# Altium footprint library Transformers.PcbLib: 80 footprints (part 4 of 6)
Each footprint in its own frame and in the unit in brackets; x right, y up, seen from the top. Pads: shape width x height; smd on the part's side, far side on the other; paste and mask are expansions set on the pad; w line width, h text height; cw(c..) or ccw(c..) is an arc to the next point about the centre after c.
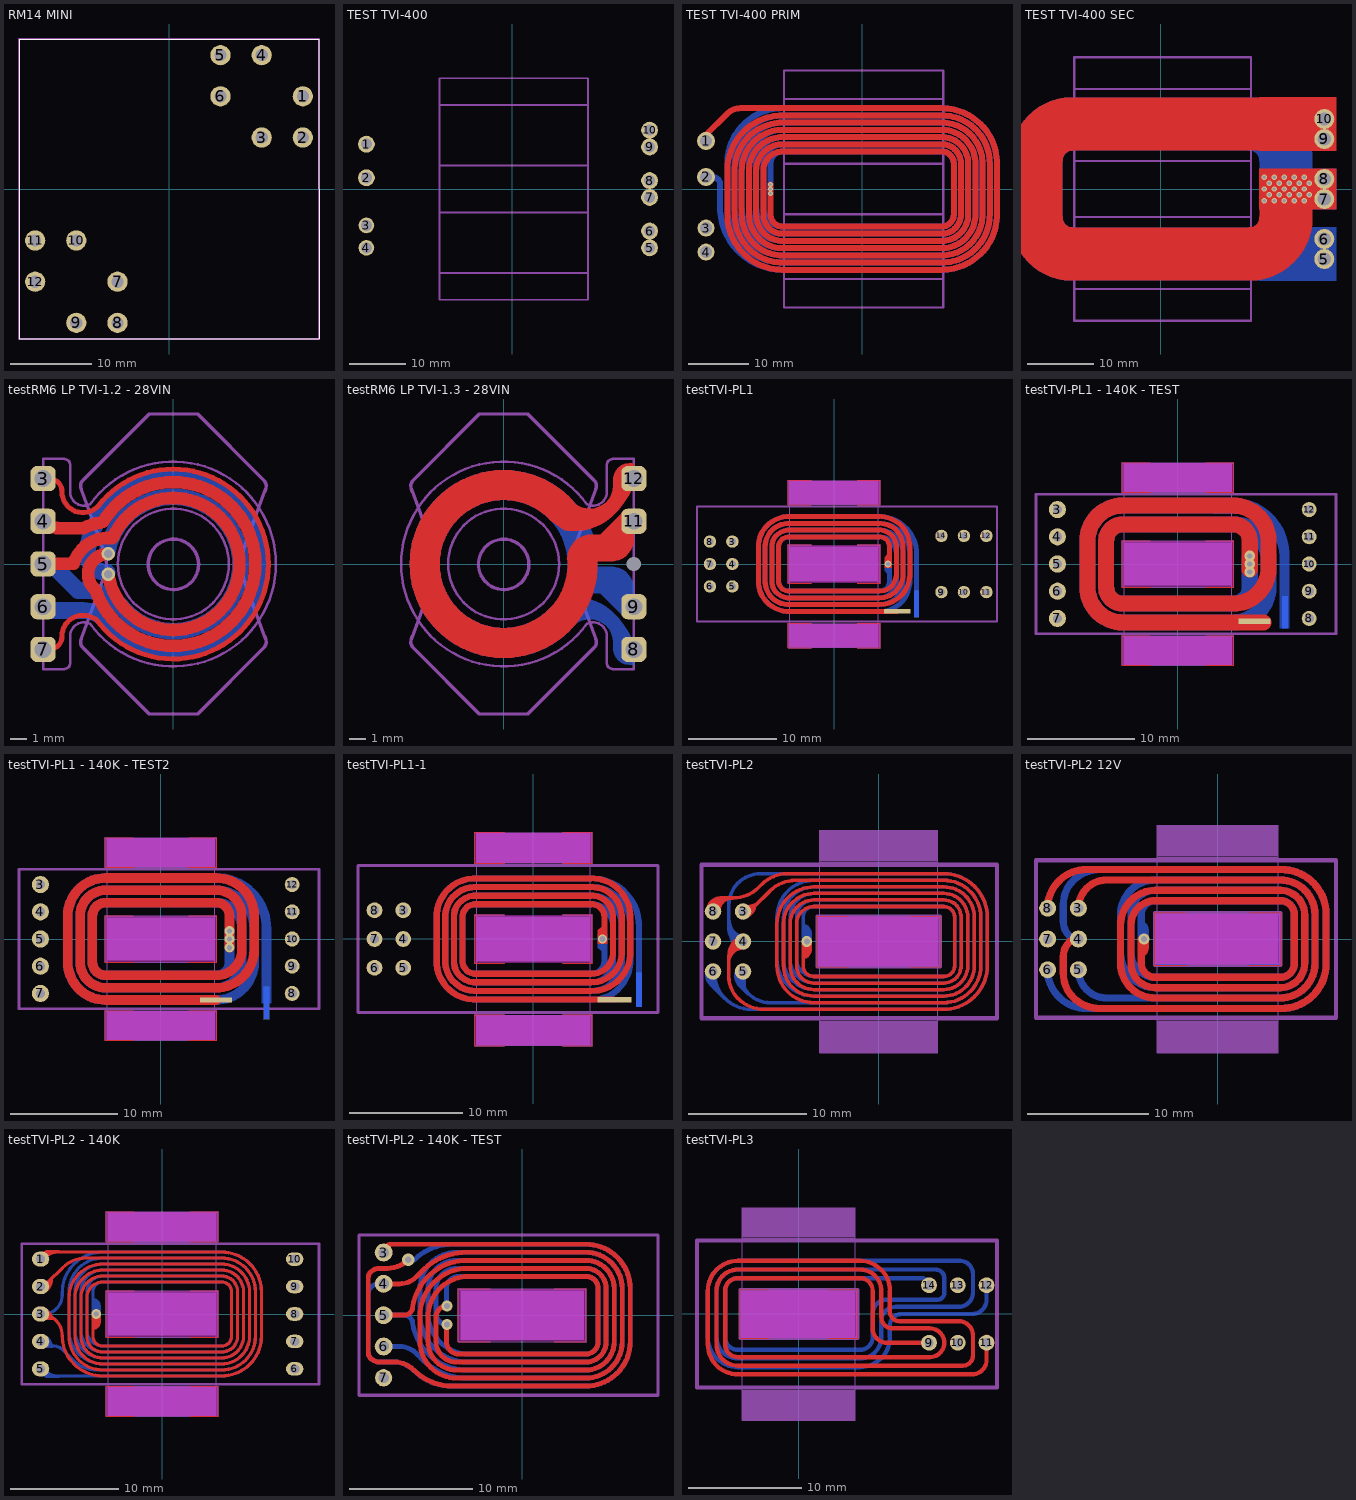
[diagram p3: the footprints below, top view; thin cyan lines are the x and y axes]

## RM14 MINI [mm]
pads (12):
  round 2.5 hole 1.5: 1(16.51,11.43) 2(16.51,6.35) 3(11.43,6.35) 4(11.43,16.51) 5(6.35,16.51) 6(6.35,11.43) 7(-6.35,-11.43) 8(-6.35,-16.51) 9(-11.43,-16.51) 10(-11.43,-6.35) 11(-16.51,-6.35) 12(-16.51,-11.43)
Top Overlay:
  lines w0.15: -18.5,-18.5 18.5,-18.5 18.5,18.5 -18.5,18.5 -18.5,-18.5
Mechanical 13:
  lines w0.25: -18.5,-18.5 18.5,-18.5 18.5,18.5 -18.5,18.5 -18.5,-18.5
3D body "RM14-K-12P-TBI.STEP": height 29.67, standoff -1.3, extent -30.017,-30.017 30.017,30.017

## TEST TVI-400 [mm]
pads (10):
  round 3 hole 2: 1(-26,8) 2(-26,2) 5(24.5,-10.5) 6(24.5,-7.5) 7(24.5,-1.5) 8(24.5,1.5) 9(24.5,7.5) 10(24.5,10.5)
  round 2.8 hole 2: 3(-26,-6.5) 4(-26,-10.5)
Mechanical 13:
  lines w0.35: -13,-15 13.5,-15 ; -13,-4.2 13.5,-4.2 ; -13,4.2 13.5,4.2 ; -13,15 13.5,15 ; -13,-19.75 -13,0 -13,19.75 13.5,19.75 13.5,0 13.5,-19.75 -13,-19.75

## TEST TVI-400 PRIM [mm]
pads (4):
  round 3 hole 2: 1(-26,8) 2(-26,2)
  round 2.8 hole 2: 3(-26,-6.5) 4(-26,-10.5)
via -15.25,-0.75 diameter 0.8 hole 0.5
via -15.25,0 diameter 0.8 hole 0.5
via -15.25,0.75 diameter 0.8 hole 0.5
Top Layer:
  lines w1: -26,8 -26,9 -22.448,12.552 cw(c-20.28,10.384) -20.28,13.45 -13.25,13.45 13.25,13.45 cw(c13.25,4.25) 22.45,4.25 22.45,-4.25 cw(c13.25,-4.25) 13.25,-13.45 -13.25,-13.45 cw(c-13.25,-4.25) -22.45,-4.25 -22.45,0 -22.45,3.05 cw(c-13.25,3.05) -13.25,12.25 13.25,12.25 cw(c13.25,4.25) 21.25,4.25 21.25,-4.25 cw(c13.25,-4.25) 13.25,-12.25 -13.25,-12.25 cw(c-13.25,-4.25) -21.25,-4.25 -21.25,0 -21.25,3.05 cw(c-13.25,3.05) -13.25,11.05 13.25,11.05 cw(c13.25,4.25) 20.05,4.25 20.05,-4.25 cw(c13.25,-4.25) 13.25,-11.05 -13.25,-11.05 cw(c-13.25,-4.25) -20.05,-4.25 -20.05,0 -20.05,3.05 cw(c-13.25,3.05) -13.25,9.85 13.25,9.85 cw(c13.25,4.25) 18.85,4.25 18.85,-4.25 cw(c13.25,-4.25) 13.25,-9.85 -13.25,-9.85 cw(c-13.25,-4.25) -18.85,-4.25 -18.85,0 -18.85,3.05 cw(c-13.25,3.05) -13.25,8.65 13.25,8.65 cw(c13.25,4.25) 17.65,4.25 17.65,-4.25 cw(c13.25,-4.25) 13.25,-8.65 -13.25,-8.65 cw(c-13.25,-4.25) -17.65,-4.25 -17.65,0 -17.65,3.05 cw(c-13.25,3.05) -13.25,7.45 13.25,7.45 cw(c13.25,4.25) 16.45,4.25 16.45,-4.25 cw(c13.25,-4.25) 13.25,-7.45 -13.25,-7.45 cw(c-13.25,-4.25) -16.45,-4.25 -16.45,0 -16.45,3.05 cw(c-13.25,3.05) -13.25,6.25 13.25,6.25 cw(c13.25,4.25) 15.25,4.25 15.25,-4.25 cw(c13.25,-4.25) 13.25,-6.25 -13.25,-6.25 cw(c-13.25,-4.25) -15.25,-4.25 -15.25,0.75
Bottom Layer:
  lines w1: -27,2 -24.92,2 cw(c-24.92,0.73) -23.65,0.73 -23.65,0 -23.65,-3.05 ccw(c-13.25,-3.05) -13.25,-13.45 13.25,-13.45 ccw(c13.25,-4.25) 22.45,-4.25 22.45,4.25 ccw(c13.25,4.25) 13.25,13.45 -13.25,13.45 ccw(c-13.25,4.25) -22.45,4.25 -22.45,0 -22.45,-3.05 ccw(c-13.25,-3.05) -13.25,-12.25 13.25,-12.25 ccw(c13.25,-4.25) 21.25,-4.25 21.25,4.25 ccw(c13.25,4.25) 13.25,12.25 -13.25,12.25 ccw(c-13.25,4.25) -21.25,4.25 -21.25,0 -21.25,-3.05 ccw(c-13.25,-3.05) -13.25,-11.05 13.25,-11.05 ccw(c13.25,-4.25) 20.05,-4.25 20.05,4.25 ccw(c13.25,4.25) 13.25,11.05 -13.25,11.05 ccw(c-13.25,4.25) -20.05,4.25 -20.05,0 -20.05,-3.05 ccw(c-13.25,-3.05) -13.25,-9.85 13.25,-9.85 ccw(c13.25,-4.25) 18.85,-4.25 18.85,4.25 ccw(c13.25,4.25) 13.25,9.85 -13.25,9.85 ccw(c-13.25,4.25) -18.85,4.25 -18.85,0 -18.85,-3.05 ccw(c-13.25,-3.05) -13.25,-8.65 13.25,-8.65 ccw(c13.25,-4.25) 17.65,-4.25 17.65,4.25 ccw(c13.25,4.25) 13.25,8.65 -13.25,8.65 ccw(c-13.25,4.25) -17.65,4.25 -17.65,0 -17.65,-3.05 ccw(c-13.25,-3.05) -13.25,-7.45 13.25,-7.45 ccw(c13.25,-4.25) 16.45,-4.25 16.45,4.25 ccw(c13.25,4.25) 13.25,7.45 -13.25,7.45 ccw(c-13.25,4.25) -16.45,4.25 -16.45,0 -16.45,-3.05 ccw(c-13.25,-3.05) -13.25,-6.25 13.25,-6.25 ccw(c13.25,-4.25) 15.25,-4.25 15.25,4.25 ccw(c13.25,4.25) 13.25,6.25 -13.25,6.25 ccw(c-13.25,4.25) -15.25,4.25 -15.25,-0.75
Mechanical 13:
  lines w0.35: -13,-15 13.5,-15 ; -13,-4.2 13.5,-4.2 ; -13,4.2 13.5,4.2 ; -13,15 13.5,15 ; -13,-19.75 -13,0 -13,19.75 13.5,19.75 13.5,0 13.5,-19.75 -13,-19.75

## TEST TVI-400 SEC [mm]
pads (6):
  round 3 hole 2: 5(24.5,-10.5) 6(24.5,-7.5) 7(24.5,-1.5) 8(24.5,1.5) 9(24.5,7.5) 10(24.5,10.5)
via 15.5,-1.75 diameter 0.8 hole 0.5
via 17,-1.75 diameter 0.8 hole 0.5
via 18.5,-1.75 diameter 0.8 hole 0.5
via 20,-1.75 diameter 0.8 hole 0.5
via 21.5,-1.75 diameter 0.8 hole 0.5
via 16.25,-0.875 diameter 0.8 hole 0.5
via 17.75,-0.875 diameter 0.8 hole 0.5
via 19.25,-0.875 diameter 0.8 hole 0.5
via 20.75,-0.875 diameter 0.8 hole 0.5
via 22.25,-0.875 diameter 0.8 hole 0.5
via 22.25,0.875 diameter 0.8 hole 0.5
via 20.75,0.875 diameter 0.8 hole 0.5
via 19.25,0.875 diameter 0.8 hole 0.5
via 17.75,0.875 diameter 0.8 hole 0.5
via 16.25,0.875 diameter 0.8 hole 0.5
via 15.5,1.75 diameter 0.8 hole 0.5
via 21.5,0 diameter 0.8 hole 0.5
via 20,0 diameter 0.8 hole 0.5
via 18.5,0 diameter 0.8 hole 0.5
via 17,0 diameter 0.8 hole 0.5
via 15.5,0 diameter 0.8 hole 0.5
via 21.5,1.75 diameter 0.8 hole 0.5
via 20,1.75 diameter 0.8 hole 0.5
via 17,1.75 diameter 0.8 hole 0.5
via 18.5,1.75 diameter 0.8 hole 0.5
Top Layer:
  region: 14.75,5.75 14.75,13.75 26.25,13.75 26.25,5.75
  region: 14.75,-3 14.75,3 26.25,3 26.25,-3
  lines w8: 18.75,-4.25 cw(c13.25,-4.25) 13.25,-9.75 -13.25,-9.75 cw(c-13.25,-4.25) -18.75,-4.25 -18.75,4.25 cw(c-13.25,4.25) -13.25,9.75 18.75,9.75 ; 18.75,-4 18.75,-1
Bottom Layer:
  region: 23,1 23,3 26.25,3 26.25,1
  region: 14.75,-5.75 14.75,-13.75 26.25,-13.75 26.25,-5.75
  region: 14.75,3 14.75,-3 26.25,-3 26.25,3
  lines w8: 18.75,-9.75 -13.25,-9.75 cw(c-13.25,-4.25) -18.75,-4.25 -18.75,4.25 cw(c-13.25,4.25) -13.25,9.75 13.25,9.75 cw(c13.25,4.25) 18.75,4.25 ; 18.75,1 18.75,4
Mechanical 13:
  lines w0.35: -13,-15 13.5,-15 ; -13,-4.2 13.5,-4.2 ; -13,4.2 13.5,4.2 ; -13,15 13.5,15 ; -13,-19.75 13.5,-19.75 13.5,0 13.5,19.75 -13,19.75 -13,0 -13,-19.75

## testRM6 LP TVI-1.2 - 28VIN [mm]
pads (5):
  rrect50% 1.5x1.5 hole 1: 3(-7.75,5.08) 4(-7.75,2.54) 5(-7.75,0) 6(-7.75,-2.54) 7(-7.75,-5.08)
via -3.875,-0.6 diameter 0.8 hole 0.5
via -3.875,0.6 diameter 0.8 hole 0.5
Top Layer:
  lines w0.3: -7.75,-5.08 -7.391,-5.08 ccw(c-7.391,-4.319) -6.631,-4.319 cw(c-5.381,-4.302) -4.842,-3.174 -4.591,-3.293 ccw(c0,0) 5.65,0 ccw(c0,0) 0,5.65 ccw(c0,0) -4.46,3.469 ; -7.75,5.08 cw(c-7.75,4.67) -7.46,4.96 ; -7.391,5.08 cw(c-7.391,4.319) -6.631,4.319 ccw(c-5.381,4.302) -4.457,3.461
  lines w0.75: -7.71,2.5 -7.75,2.54 ccw(c-6.758,3.532) -6.758,2.129 -5.345,2.129 cw(c-3.875,-0.6) -4.352,2.463 ; -4.627,-1.535 cw(c-3.875,-0.6) -3.875,0.6 ; -4.625,-1.542 ccw(c0,0) 0,-4.875 ccw(c0,0) 4.875,0 ccw(c0,0) 0,4.875 ccw(c0,0) -4.171,2.523 ; -4.488,1.461 -4.485,1.461 ; -3.879,-0.601 ccw(c0,0) 0,-3.925 ccw(c0,0) 3.925,0 ccw(c0,0) 0,3.925 ccw(c0,0) -3.587,1.594 ; -3.651,1.538 ccw(c-3.875,-0.6) -5.935,0.017 -7.733,0.017 ; -7.733,0.017 ccw(c-7.733,0) -7.75,0 cw(c-7.733,0) -7.733,0.017
Mid-Layer 14:
  lines w0.15: -7.75,-5.58 ccw(c-7.75,-5.08) -7.75,-4.58 ; -7.75,-3.04 ccw(c-7.75,-2.54) -7.75,-2.04 ; -7.75,2.04 ccw(c-7.75,2.54) -7.75,3.04 ; -7.75,4.58 ccw(c-7.75,5.08) -7.75,5.58
Bottom Layer:
  lines w0.254: -7.75,-2.54 ccw(c-7.423,-2.213) -7.423,-2.675
  lines w1: -7.198,-0.052 -5.677,-1.573 -5.3,-1.573 cw(c-5.3,-4.584) -3.17,-2.455 ; -7.189,-2.773 -5.4,-2.773 cw(c-5.4,-4.773) -3.986,-3.358 -3.862,-3.482 ccw(c0,0) 0,-5.2 ccw(c0,0) 5.2,0 ccw(c0,0) 0,5.2 ccw(c0,0) -5.148,0.73 ; -5.142,0.836 ccw(c-3.95,0.7) -3.95,-0.5 ; -3.938,0.7 cw(c0,0) 0,4 cw(c0,0) 4,0 cw(c0,0) 0,-4 cw(c0,0) -3.163,-2.449 ; -7.75,-2.54 cw(c-7.693,-2.597) -7.693,-2.516 ccw(c-7.693,-2.597) -7.75,-2.54
Mechanical 2:
  circle w0.15: c0,0 r3.302
  lines w0.15: -4.978,-3.556 ccw(c-5.329,-4.289) -6.141,-4.301 -6.141,-5.706 -6.141,-5.891 cw(c-6.5,-5.891) -6.5,-6.25 -7.75,-6.25 -7.75,6.25 ; -4.978,3.556 cw(c-5.329,4.289) -6.141,4.301 -6.141,5.706 -6.141,5.891 ccw(c-6.5,5.891) -6.5,6.25 -7.541,6.25 -7.75,6.25 ; -4.961,-3.543 ccw(c0,0) 6.096,0 ccw(c0,0) -4.961,3.543 ; -7.75,6.25 ccw(c-7.75,6.25) -7.75,6.25 ; -7.75,6.25 ccw(c-7.75,6.25) -7.75,6.25 ; -7.75,6.25 -7.75,6.25
Mechanical 13:
  circle w0.2: c0.002,-0.023 r1.5
  lines w0.2: -5.434,-4.308 -5.493,-4.471 ccw(c-5.023,-4.642) -5.377,-4.996 -1.446,-8.927 1.446,-8.927 5.377,-4.996 ccw(c5.023,-4.642) 5.493,-4.471 5.434,-4.308 ; -5.434,4.308 -5.493,4.471 cw(c-5.023,4.642) -5.377,4.996 -1.446,8.927 1.446,8.927 5.377,4.996 cw(c5.023,4.642) 5.493,4.471 5.434,4.308 ; -4.103,-0.707 ccw(c-5.982,-0.023) -4.103,0.661 -5.49,4.471 cw(c-5.02,4.642) -5.373,4.996 -3.14,7.23 ; -4.103,0.707 cw(c-5.982,0.023) -4.103,-0.661 -5.49,-4.471 ccw(c-5.02,-4.642) -5.373,-4.996 -3.14,-7.23 ; 0,1.477 cw(c-0.002,-0.023) 1.498,-0.023 ; 3.14,-7.23 5.373,-4.996 ccw(c5.02,-4.642) 5.49,-4.471 4.103,-0.661 cw(c5.982,0.023) 4.103,0.707 ; 3.14,7.23 5.373,4.996 cw(c5.02,4.642) 5.49,4.471 4.103,0.661 ccw(c5.982,-0.023) 4.103,-0.707

## testRM6 LP TVI-1.3 - 28VIN [mm]
pads (5):
  rrect50% 1.5x1.5 hole 1: 8(7.75,-5.08) 9(7.75,-2.54) 11(7.75,2.54) 12(7.75,5.08)
  round 0 hole 0.85: 10(7.75,0)
Top Layer:
  region: 3.8,0.175 3.787,0.318 3.819,0.603 3.905,0.877 4.043,1.129 4.227,1.349 4.451,1.529 4.706,1.662 4.982,1.742 5.125,1.755 5.755,1.755 7.228,3.228 7.75,3.228 7.75,1.5 7.75,1.369 7.699,1.114 7.599,0.872 7.454,0.655 7.27,0.471 7.053,0.326 6.811,0.226 6.556,0.175 6.425,0.175
  region: 3.8,0.175
  region: 4.275,3.575 4.385,3.499 4.624,3.379 4.882,3.307 5.148,3.285 5.414,3.314 5.67,3.394 5.905,3.52 6.113,3.689 6.284,3.895 6.413,4.129 6.496,4.383 6.528,4.649 6.525,4.783 6.525,5.025 6.525,5.138 6.577,5.358 6.678,5.561 6.822,5.735 7.003,5.871 7.209,5.963 7.432,6.004 7.658,5.994 7.767,5.963 7.78,5.745 7.764,5.31 7.704,4.878 7.6,4.455 7.527,4.25 7.41,4.02 7.13,3.588 6.809,3.185 6.448,2.817 6.25,2.652 6.11,2.547 5.811,2.367 5.494,2.218 5.165,2.101 4.825,2.019 4.478,1.971 4.129,1.958 3.78,1.981 3.608,2.01 3,2.414 3,3 3.127,3.126 3.422,3.329 3.749,3.476 4.096,3.563
  region: 6.75,2.75 7.25,3.25 7.75,2.75 7.75,1.5 7.25,1.5 6.875,1.125 6.75,1.25
  lines w1.8: 3.435,3.208 ccw(c0,0) 0,4.7 ccw(c0,0) -4.7,0 ccw(c0,0) 0,-4.7 ccw(c0,0) 4.7,0
Mid-Layer 14:
  lines w0.15: 7.75,-5.58 cw(c7.75,-5.08) 7.75,-4.58 ; 7.75,2.04 cw(c7.75,2.54) 7.75,3.04 ; 7.75,4.58 cw(c7.75,5.08) 7.75,5.58
Bottom Layer:
  region: 4.275,-3.575 4.385,-3.499 4.624,-3.379 4.882,-3.307 5.148,-3.285 5.414,-3.314 5.67,-3.394 5.905,-3.52 6.113,-3.689 6.284,-3.895 6.413,-4.129 6.496,-4.383 6.528,-4.649 6.525,-4.783 6.525,-5.025 6.525,-5.138 6.577,-5.358 6.678,-5.561 6.822,-5.735 7.003,-5.871 7.209,-5.963 7.432,-6.004 7.658,-5.994 7.767,-5.963 7.78,-5.745 7.764,-5.31 7.704,-4.878 7.6,-4.455 7.527,-4.25 7.41,-4.02 7.13,-3.588 6.809,-3.185 6.448,-2.817 6.25,-2.652 6.11,-2.547 5.811,-2.367 5.494,-2.218 5.165,-2.101 4.825,-2.019 4.478,-1.971 4.129,-1.958 3.78,-1.981 3.608,-2.01 3,-2.414 3,-3 3.127,-3.126 3.422,-3.329 3.749,-3.476 4.096,-3.563
  region: 3.8,-0.175 3.787,-0.318 3.819,-0.603 3.905,-0.877 4.043,-1.129 4.227,-1.349 4.451,-1.529 4.706,-1.662 4.982,-1.742 5.125,-1.755 5.755,-1.755 7.228,-3.228 7.75,-3.228 7.75,-1.5 7.75,-1.369 7.699,-1.114 7.599,-0.872 7.454,-0.655 7.27,-0.471 7.053,-0.326 6.811,-0.226 6.556,-0.175 6.425,-0.175
  lines w1.8: 3.435,-3.208 cw(c0,0) 0,-4.7 cw(c0,0) -4.7,0 cw(c0,0) 0,4.7 cw(c0,0) 4.7,0
Mechanical 2:
  circle w0.15: c0,0 r3.302
  lines w0.15: 4.961,-3.543 cw(c0,0) -6.096,0 cw(c0,0) 4.961,3.543 ; 4.978,-3.556 cw(c5.329,-4.289) 6.141,-4.301 6.141,-5.706 6.141,-5.891 ccw(c6.5,-5.891) 6.5,-6.25 7.75,-6.25 7.75,6.25 ; 4.978,3.556 ccw(c5.329,4.289) 6.141,4.301 6.141,5.706 6.141,5.891 cw(c6.5,5.891) 6.5,6.25 7.541,6.25 7.75,6.25 ; 7.75,6.25 ccw(c7.75,6.25) 7.75,6.25 ; 7.75,6.25 ccw(c7.75,6.25) 7.75,6.25 ; 7.75,6.25 7.75,6.25
Mechanical 13:
  circle w0.2: c0.002,-0.023 r1.5
  lines w0.2: -5.434,-4.308 -5.493,-4.471 ccw(c-5.023,-4.642) -5.377,-4.996 -1.446,-8.927 1.446,-8.927 5.377,-4.996 ccw(c5.023,-4.642) 5.493,-4.471 5.434,-4.308 ; -5.434,4.308 -5.493,4.471 cw(c-5.023,4.642) -5.377,4.996 -1.446,8.927 1.446,8.927 5.377,4.996 cw(c5.023,4.642) 5.493,4.471 5.434,4.308 ; -4.103,-0.707 ccw(c-5.982,-0.023) -4.103,0.661 -5.49,4.471 cw(c-5.02,4.642) -5.373,4.996 -3.14,7.23 ; -4.103,0.707 cw(c-5.982,0.023) -4.103,-0.661 -5.49,-4.471 ccw(c-5.02,-4.642) -5.373,-4.996 -3.14,-7.23 ; 0,1.477 cw(c-0.002,-0.023) 1.498,-0.023 ; 3.14,-7.23 5.373,-4.996 ccw(c5.02,-4.642) 5.49,-4.471 4.103,-0.661 cw(c5.982,0.023) 4.103,0.707 ; 3.14,7.23 5.373,4.996 cw(c5.02,4.642) 5.49,4.471 4.103,0.661 ccw(c5.982,-0.023) 4.103,-0.707

## testTVI-PL1 [mm]
pads (14):
  rect 3x0.5 smd: 1(7.15,-5.352)
  rect 0.5x3 smd far side: 2(9.314,-4.5)
  round 1.4 hole 0.8: 3(-11.5,2.54) 4(-11.5,0) 5(-11.5,-2.54) 6(-14.04,-2.54) 7(-14.04,0) 8(-14.04,2.54) 9(12.135,-3.175) 10(14.675,-3.175) 11(17.215,-3.175) 12(17.215,3.175) 13(14.675,3.175) 14(12.135,3.175)
via 6.1,0 diameter 0.8 hole 0.5
Top Layer:
  region: 401 vertices and 0 holes, not listed, extent -8.806,-5.606 8.806,5.606
  region: 6.012,1.075 5.7,0.763 5.7,-0.4 6.5,-0.4 6.5,1.075
  lines w0.1: -2.6,-9.45 -5.2,-9.45 -5.2,-6.7 -2.6,-6.7 ; -2.6,-2.15 -5.2,-2.15 -5.2,2.15 -2.6,2.15 ; -2.6,6.7 -5.2,6.7 -5.2,9.45 -2.6,9.45 ; 2.6,-9.45 5.2,-9.45 5.2,-6.7 2.6,-6.7 ; 2.6,-2.15 5.2,-2.15 5.2,2.15 2.6,2.15 ; 2.6,6.7 5.2,6.7 5.2,9.45 2.6,9.45
  text "1" at 5.5,1.5 h0.5
Bottom Layer:
  region: 430 vertices and 0 holes, not listed, extent -8.806,-5.606 9.568,5.606
  region: 6.012,-1.075 5.7,-0.763 5.7,0.4 6.5,0.4 6.5,-1.075
  lines w0.1: -2.6,-9.45 -5.2,-9.45 -5.2,-6.7 -2.6,-6.7 ; -2.6,-2.15 -5.2,-2.15 -5.2,2.15 -2.6,2.15 ; -2.6,6.7 -5.2,6.7 -5.2,9.45 -2.6,9.45 ; 2.6,-9.45 5.2,-9.45 5.2,-6.7 2.6,-6.7 ; 2.6,-2.15 5.2,-2.15 5.2,2.15 2.6,2.15 ; 2.6,6.7 5.2,6.7 5.2,9.45 2.6,9.45
  text "2" at 5.7,-1.7 h0.5
Keep-Out Layer:
  board cut-out: -5.15,9.4 -5.15,6.75 5.15,6.75 5.15,9.4
  board cut-out: -5.15,-6.75 -5.15,-9.4 5.15,-9.4 5.15,-6.75
  board cut-out: -5.15,2.1 -5.15,-2.1 5.15,-2.1 5.15,2.1
Mechanical 1:
  lines w0.254: -15.5,-6.5 18.415,-6.5 18.415,6.5 -5.5,6.5 -15.5,6.5 -15.5,-6.5
Mechanical 2:
  lines w0.1: -2.6,-9.45 -5.2,-9.45 -5.2,-6.7 -2.6,-6.7 ; -2.6,-2.15 -5.2,-2.15 -5.2,2.15 -2.6,2.15 ; -2.6,6.7 -5.2,6.7 -5.2,9.45 -2.6,9.45 ; 2.6,-9.45 5.2,-9.45 5.2,-6.7 2.6,-6.7 ; 2.6,-2.15 5.2,-2.15 5.2,2.15 2.6,2.15 ; 2.6,6.7 5.2,6.7 5.2,9.45 2.6,9.45
Mechanical 13:
  rectangle: -5,-9.4 5,-6.8
  rectangle: -5,-2 5,2
  rectangle: -5,6.75 5,9.35
  lines w0.1: -5,-6.75 5,-6.75 ; -5,-1.9 5,-1.9 ; -5,1.9 5,1.9 ; -5,6.75 5,6.75 ; -5,-9.4 5,-9.4 5,9.4 -5,9.4 -5,0 -5,-9.4
3D body: height 4, standoff 2, extent -5.15,-9.4 5.15,9.4
3D body: height 4, standoff 2, extent -5.15,-9.4 5.15,9.4
3D body: height 4, standoff -4, extent -5,-1.9 5,2
3D body: height 4, standoff -4, extent -5,-9.45 5,-6.8
3D body: height 4, standoff -4, extent -5,6.75 5,9.4

## testTVI-PL1 - 140K - TEST [mm]
pads (12):
  rect 3x0.5 smd: 1(7.15,-5.352)
  rect 0.5x3 smd far side: 2(10,-4.5)
  round 1.6 hole 0.85: 3(-11.25,5.08) 4(-11.25,2.54) 5(-11.25,0) 6(-11.25,-2.54) 7(-11.25,-5.08)
  round 1.4 hole 0.85: 8(12.25,-5.08) 9(12.25,-2.54) 10(12.25,0) 11(12.25,2.54) 12(12.25,5.08)
via 6.7,-0.75 diameter 1 hole 0.5
via 6.7,0.75 diameter 1 hole 0.5
via 6.7,0 diameter 1 hole 0.5
Top Layer:
  lines w0.1: -2.6,-9.45 -5.2,-9.45 -5.2,-6.7 -2.6,-6.7 ; -2.6,-2.15 -5.2,-2.15 -5.2,2.15 -2.6,2.15 ; -2.6,6.7 -5.2,6.7 -5.2,9.45 -2.6,9.45 ; 2.6,-9.45 5.2,-9.45 5.2,-6.7 2.6,-6.7 ; 2.6,-2.15 5.2,-2.15 5.2,2.15 2.6,2.15 ; 2.6,6.7 5.2,6.7 5.2,9.45 2.6,9.45
  lines w1.5: 6.7,-0.5 6.7,2.15 ccw(c5.15,2.15) 5.15,3.7 -5.15,3.7 ccw(c-5.15,2.15) -6.7,2.15 -6.7,-2.15 ccw(c-5.15,-2.15) -5.15,-3.7 5.15,-3.7 ccw(c5.15,-0.4) 8.45,-0.4 8.45,0 8.45,2.15 ccw(c5.15,2.15) 5.15,5.45 -5.15,5.45 ccw(c-5.15,2.15) -8.45,2.15 -8.45,-2.15 ccw(c-5.15,-2.15) -5.15,-5.45 8,-5.45
  text "1" at 5.5,1.5 h0.5
Bottom Layer:
  region: 3.3,4.7 5.225,4.7 5.506,4.691 6.064,4.617 6.607,4.472 7.127,4.257 7.614,3.975 8.06,3.633 8.458,3.235 8.8,2.789 9.082,2.302 9.297,1.782 9.442,1.239 9.516,0.681 9.525,0.4 10,0.4 10.08,0.4 10.227,0.461 10.339,0.573 10.4,0.72 10.4,0.8 10.4,1.154 10.308,1.856 10.124,2.539 9.854,3.193 9.5,3.807 9.069,4.368 8.568,4.869 8.007,5.3 7.393,5.654 6.739,5.924 6.056,6.108 5.354,6.2 5,6.2 3.3,6.2
  region: 9.516,0.977 9.516,-6 10.4,-6 10.4,0.977
  lines w0.1: -2.6,-9.45 -5.2,-9.45 -5.2,-6.7 -2.6,-6.7 ; -2.6,-2.15 -5.2,-2.15 -5.2,2.15 -2.6,2.15 ; -2.6,6.7 -5.2,6.7 -5.2,9.45 -2.6,9.45 ; 2.6,-9.45 5.2,-9.45 5.2,-6.7 2.6,-6.7 ; 2.6,-2.15 5.2,-2.15 5.2,2.15 2.6,2.15 ; 2.6,6.7 5.2,6.7 5.2,9.45 2.6,9.45
  lines w1.5: 3.35,5.45 -5.15,5.45 ccw(c-5.15,2.15) -8.45,2.15 -8.45,-2.15 ccw(c-5.15,-2.15) -5.15,-5.45 5.15,-5.45 ccw(c5.15,-2.15) 8.45,-2.15 8.45,0 8.45,0.4 ccw(c5.15,0.4) 5.15,3.7 -5.15,3.7 ccw(c-5.15,2.15) -6.7,2.15 -6.7,-2.15 ccw(c-5.15,-2.15) -5.15,-3.7 5.15,-3.7 ccw(c5.15,-2.15) 6.7,-2.15 6.7,0.5
  text "2" at 5.7,-1.7 h0.5
Keep-Out Layer:
  board cut-out: -5.15,9.4 -5.15,6.75 5.15,6.75 5.15,9.4
  board cut-out: -5.15,-6.75 -5.15,-9.4 5.15,-9.4 5.15,-6.75
  board cut-out: -5.15,2.1 -5.15,-2.1 5.15,-2.1 5.15,2.1
Mechanical 1:
  lines w0.254: -13.25,-6.5 14.75,-6.5 14.75,6.5 -5.5,6.5 -13.25,6.5 -13.25,-6.5
Mechanical 2:
  lines w0.1: -5.2,-9.45 2.6,-9.45 5.2,-9.45 5.2,-6.7 2.6,-6.7 -5.2,-6.7 -5.2,-9.45 ; -5.2,-2.15 -5.2,2.15 2.6,2.15 5.2,2.15 5.2,-2.15 2.6,-2.15 -5.2,-2.15 ; -5.2,6.7 2.6,6.7 5.2,6.7 5.2,9.45 2.6,9.45 -5.2,9.45 -5.2,6.7
Mechanical 13:
  rectangle: -5,-9.4 5,-6.8
  rectangle: -5,-2 5,2
  rectangle: -5,6.75 5,9.35
  lines w0.1: -5,-6.75 5,-6.75 ; -5,-1.9 5,-1.9 ; -5,1.9 5,1.9 ; -5,6.75 5,6.75 ; -5,-9.4 5,-9.4 5,9.4 -5,9.4 -5,0 -5,-9.4
3D body: height 4, standoff 2, extent -5.15,-9.4 5.15,9.4
3D body: height 4, standoff 2, extent -5.15,-9.4 5.15,9.4
3D body: height 4, standoff -4, extent -5,-1.9 5,2
3D body: height 4, standoff -4, extent -5,-9.45 5,-6.8
3D body: height 4, standoff -4, extent -5,6.75 5,9.4

## testTVI-PL1 - 140K - TEST2 [mm]
pads (12):
  rect 3x0.5 smd: 1(5.15,-5.7)
  rect 0.5x3 smd far side: 2(9.85,-5.977)
  round 1.6 hole 0.85: 3(-11.25,5.08) 4(-11.25,2.54) 5(-11.25,0) 6(-11.25,-2.54) 7(-11.25,-5.08)
  round 1.4 hole 0.85: 8(12.25,-5.08) 9(12.25,-2.54) 10(12.25,0) 11(12.25,2.54) 12(12.25,5.08)
via 6.4,0.75 diameter 0.9 hole 0.5
via 6.4,0 diameter 0.9 hole 0.5
via 6.4,-0.8 diameter 0.9 hole 0.5
Top Layer:
  lines w0.1: -2.6,-9.45 -5.2,-9.45 -5.2,-6.7 -2.6,-6.7 ; -2.6,-2.15 -5.2,-2.15 -5.2,2.15 -2.6,2.15 ; -2.6,6.7 -5.2,6.7 -5.2,9.45 -2.6,9.45 ; 2.6,-9.45 5.2,-9.45 5.2,-6.7 2.6,-6.7 ; 2.6,-2.15 5.2,-2.15 5.2,2.15 2.6,2.15 ; 2.6,6.7 5.2,6.7 5.2,9.45 2.6,9.45
  lines w0.9: 5.15,-5.7 -5.15,-5.7 cw(c-5.15,-2.15) -8.7,-2.15 -8.7,2.15 cw(c-5.15,2.15) -5.15,5.7 5.15,5.7 cw(c5.15,2.15) 8.7,2.15 8.7,0 8.7,-1 cw(c5.15,-1) 5.15,-4.55 -5.15,-4.55 cw(c-5.15,-2.15) -7.55,-2.15 -7.55,2.15 cw(c-5.15,2.15) -5.15,4.55 5.15,4.55 cw(c5.15,2.15) 7.55,2.15 7.55,0 7.55,-1 cw(c5.15,-1) 5.15,-3.4 -5.15,-3.4 cw(c-5.15,-2.15) -6.4,-2.15 -6.4,2.15 cw(c-5.15,2.15) -5.15,3.4 5.15,3.4 cw(c5.15,2.15) 6.4,2.15 6.4,-0.8
  text "1" at 5.5,1.5 h0.5
Bottom Layer:
  region: 9.408,1 9.408,-5.977 10.292,-5.977 10.292,1
  lines w0.1: -2.6,-9.45 -5.2,-9.45 -5.2,-6.7 -2.6,-6.7 ; -2.6,-2.15 -5.2,-2.15 -5.2,2.15 -2.6,2.15 ; -2.6,6.7 -5.2,6.7 -5.2,9.45 -2.6,9.45 ; 2.6,-9.45 5.2,-9.45 5.2,-6.7 2.6,-6.7 ; 2.6,-2.15 5.2,-2.15 5.2,2.15 2.6,2.15 ; 2.6,6.7 5.2,6.7 5.2,9.45 2.6,9.45
  lines w0.9: 6.4,0.8 6.4,-2.15 cw(c5.15,-2.15) 5.15,-3.4 -5.15,-3.4 cw(c-5.15,-2.15) -6.4,-2.15 -6.4,2.15 cw(c-5.15,2.15) -5.15,3.4 5.15,3.4 cw(c5.15,1) 7.55,1 7.55,0 7.55,-2.15 cw(c5.15,-2.15) 5.15,-4.55 -5.15,-4.55 cw(c-5.15,-2.15) -7.55,-2.15 -7.55,2.15 cw(c-5.15,2.15) -5.15,4.55 5.15,4.55 cw(c5.15,1) 8.7,1 8.7,0 8.7,-2.15 cw(c5.15,-2.15) 5.15,-5.7 -5.15,-5.7 cw(c-5.15,-2.15) -8.7,-2.15 -8.7,2.15 cw(c-5.15,2.15) -5.15,5.7 5.15,5.7 cw(c5.15,1) 9.85,1
  text "2" at 5.7,-1.7 h0.5
Keep-Out Layer:
  board cut-out: -5.15,9.4 -5.15,6.75 5.15,6.75 5.15,9.4
  board cut-out: -5.15,-6.75 -5.15,-9.4 5.15,-9.4 5.15,-6.75
  board cut-out: -5.15,2.1 -5.15,-2.1 5.15,-2.1 5.15,2.1
Mechanical 1:
  lines w0.254: -13.25,-6.5 14.75,-6.5 14.75,6.5 -5.5,6.5 -13.25,6.5 -13.25,-6.5
Mechanical 2:
  lines w0.1: -5.2,-9.45 2.6,-9.45 5.2,-9.45 5.2,-6.7 2.6,-6.7 -5.2,-6.7 -5.2,-9.45 ; -5.2,-2.15 -5.2,2.15 2.6,2.15 5.2,2.15 5.2,-2.15 2.6,-2.15 -5.2,-2.15 ; -5.2,6.7 2.6,6.7 5.2,6.7 5.2,9.45 2.6,9.45 -5.2,9.45 -5.2,6.7
Mechanical 13:
  rectangle: -5,-9.4 5,-6.8
  rectangle: -5,-2 5,2
  rectangle: -5,6.75 5,9.35
  lines w0.1: -5,-6.75 5,-6.75 ; -5,-1.9 5,-1.9 ; -5,1.9 5,1.9 ; -5,6.75 5,6.75 ; -5,-9.4 5,-9.4 5,9.4 -5,9.4 -5,0 -5,-9.4
3D body: height 4, standoff 2, extent -5.15,-9.4 5.15,9.4
3D body: height 4, standoff 2, extent -5.15,-9.4 5.15,9.4
3D body: height 4, standoff -4, extent -5,-1.9 5,2
3D body: height 4, standoff -4, extent -5,-9.45 5,-6.8
3D body: height 4, standoff -4, extent -5,6.75 5,9.4